# Altium footprint library my Library.PcbLib: 1247 footprints (part 48 of 78)
Each footprint in its own frame and in the unit in brackets; x right, y up, seen from the top. Pads: shape width x height; smd on the part's side, far side on the other; paste and mask are expansions set on the pad; w line width, h text height; cw(c..) or ccw(c..) is an arc to the next point about the centre after c.
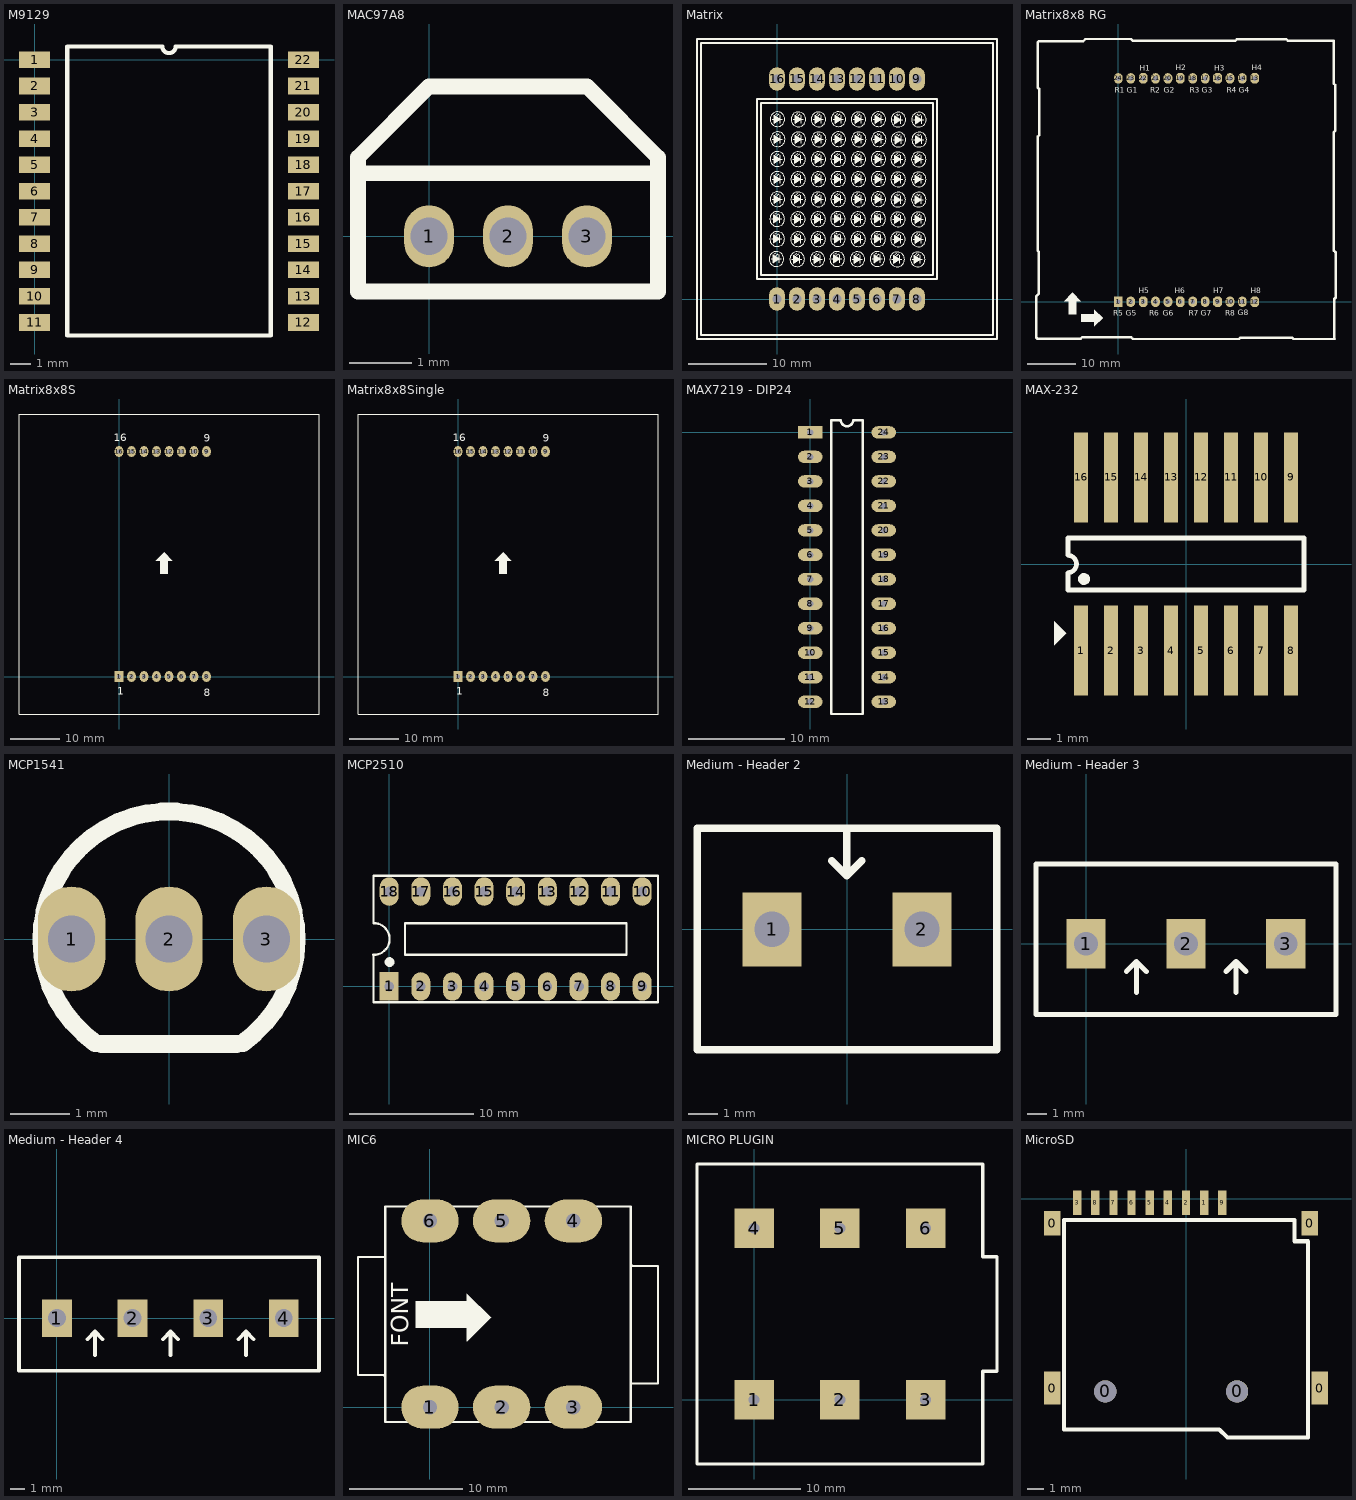
[diagram p47: the footprints below, top view; thin cyan lines are the x and y axes]

## M9129 [mm]
height 7.62
pads (22):
  rect 1.5x0.8 smd: 1(0,0) 2(0,-1.27) 3(0,-2.54) 4(0,-3.81) 5(0,-5.08) 6(0,-6.35) 7(0,-7.62) 8(0,-8.89) 9(0,-10.16) 10(0,-11.43) 11(0,-12.7) 12(13,-12.7) 13(13,-11.43) 14(13,-10.16) 15(13,-8.89) 16(13,-7.62) 17(13,-6.35) 18(13,-5.08) 19(13,-3.81) 20(13,-2.54) 21(13,-1.27) 22(13,0)
Top Overlay:
  lines w0.2: 1.585,-13.335 1.585,0.635 6.182,0.635 ccw(c6.5,0.635) 6.817,0.635 11.415,0.635 11.415,-13.335 1.585,-13.335
3D body: height 2.2, standoff 0.06, extent 0.001,-13.95 13.201,1.25

## MAC97A8 [mm]
pads (3):
  oval 0.8x1 hole 0.6: 1(0,0) 2(1.27,0) 3(2.54,0)
Top Overlay:
  lines w0.254: -1.143,1.016 3.683,1.016 ; -1.143,1.016 -1.143,1.27 0,2.413 2.54,2.413 3.683,1.27 3.683,1.016 ; -1.143,1.016 -1.143,-0.889 3.683,-0.889 3.683,1.016

## Matrix [mm]
pads (16):
  oval 2x3 hole 1.2: 1(0,0) 2(2.54,0) 3(5.08,0) 4(7.62,0) 5(10.16,0) 6(12.7,0) 7(15.24,0) 8(17.78,0) 9(17.78,27.94) 10(15.24,27.94) 11(12.7,27.94) 12(10.16,27.94) 13(7.62,27.94) 14(5.08,27.94) 15(2.54,27.94) 16(0,27.94)
Top Overlay:
  drawing of 592 lines, arcs and shapes, not listed
3D body "User Library-Bicolor-LED-Matrix.step": height 8.02, standoff -5.98, extent -7.364,-2.157 24.636,29.843

## Matrix8x8 RG [mil] "Matran 8x8 2mau,Body 60 X 60mm"
height 300
pads (24):
  rect 70x85 hole 37.4: 1(0,0)
  oval 70x85 hole 37.4: 2(100,0) 4(300,0) 5(400,0) 7(600,0) 8(700,0) 10(900,0) 11(1000,0) 14(1000,1800) 15(900,1800) 17(700,1800) 18(600,1800) 20(400,1800) 21(300,1800) 23(100,1800) 24(0,1800)
  oct 70x85 hole 37.4: 3(200,0) 6(500,0) 9(800,0) 12(1100,0) 13(1100,1800) 16(800,1800) 19(500,1800) 22(200,1800)
Top Overlay:
  region: -437,5 -371,71 -369,71 -304,6 -304,5 -341,5 -341,-101 -400,-101 -400,5
  region: -193,-63 -127,-129 -127,-131 -192,-196 -193,-196 -193,-159 -299,-159 -299,-100 -193,-100
  lines w20: -650,-300 -661,-289 -661,45 -640,66 -640,403 -650,413 -650,1331 -639,1342 -639,1716 -650,1727 -650,2090 -640,2100 -283,2100 -265,2118 103,2118 119,2102 941,2102 955,2116 1355,2116 1369,2102 1736,2102 1738,2100 1738,1757 1749,1746 1749,1379 1738,1368 1738,412 1752,398 1752,33 1742,23 1742,-299 1743,-300 1412,-300 1400,-288 984,-288 972,-300 117,-300 103,-286 -292,-286 -304,-298 -648,-298
  text "R8" at 863,-111 h45
  text "G8" at 962,-110 h45
  text "H8" at 1068,69 h45
  text "R7" at 568,-112 h45
  text "G7" at 664,-111 h45
  text "H7" at 765,68 h45
  text "R6" at 250,-111 h45
  text "G6" at 358,-111 h45
  text "H6" at 456,69 h45
  text "H5" at 166,68 h45
  text "G5" at 60,-111 h45
  text "R5" at -40,-112 h45
  text "R1" at -28,1684 h45
  text "G1" at 68,1685 h45
  text "H1" at 174,1864 h45
  text "H2" at 464,1865 h45
  text "G2" at 366,1685 h45
  text "R2" at 258,1685 h45
  text "H3" at 773,1864 h45
  text "G3" at 672,1685 h45
  text "R3" at 576,1684 h45
  text "H4" at 1076,1865 h45
  text "G4" at 970,1686 h45
  text "R4" at 874,1685 h45
Bottom Overlay:
  text "R8" at 932,-111 h45
  text "G8" at 1031,-110 h45
  text "H8" at 1137,69 h45
  text "R7" at 637,-112 h45
  text "G7" at 733,-111 h45
  text "H7" at 834,68 h45
  text "R6" at 319,-111 h45
  text "G6" at 427,-111 h45
  text "H6" at 525,69 h45
  text "H5" at 235,68 h45
  text "G5" at 129,-111 h45
  text "R5" at 29,-112 h45
  text "R1" at 41,1684 h45
  text "G1" at 137,1685 h45
  text "H1" at 243,1864 h45
  text "H2" at 533,1865 h45
  text "G2" at 435,1685 h45
  text "R2" at 327,1685 h45
  text "H3" at 842,1864 h45
  text "G3" at 741,1685 h45
  text "R3" at 645,1684 h45
  text "H4" at 1145,1865 h45
  text "G4" at 1039,1686 h45
  text "R4" at 943,1685 h45
3D body: height 150, standoff -100, extent -13.67,1785.53 16.33,1815.53
3D body: height 150, standoff -100, extent 86.33,1785.53 116.33,1815.53
3D body: height 150, standoff -100, extent 186.33,1785.53 216.33,1815.53
3D body: height 150, standoff -100, extent 286.33,1785.53 316.33,1815.53
3D body: height 150, standoff -100, extent 386.33,1785.53 416.33,1815.53
3D body: height 150, standoff -100, extent 486.33,1785.53 516.33,1815.53
3D body: height 150, standoff -100, extent 586.33,1785.53 616.33,1815.53
3D body: height 150, standoff -100, extent 686.33,1785.53 716.33,1815.53
3D body: height 150, standoff -100, extent 786.33,1785.53 816.33,1815.53
3D body: height 150, standoff -100, extent 886.33,1785.53 916.33,1815.53
3D body: height 150, standoff -100, extent 986.33,1785.53 1016.33,1815.53
3D body: height 150, standoff -100, extent -13.67,-14.47 16.33,15.53
3D body: height 150, standoff -100, extent 86.33,-14.47 116.33,15.53
3D body: height 150, standoff -100, extent 186.33,-14.47 216.33,15.53
3D body: height 150, standoff -100, extent 286.33,-14.47 316.33,15.53
3D body: height 150, standoff -100, extent 386.33,-14.47 416.33,15.53
3D body: height 150, standoff -100, extent 486.33,-14.47 516.33,15.53
3D body: height 150, standoff -100, extent 586.33,-14.47 616.33,15.53
3D body: height 150, standoff -100, extent 686.33,-14.47 716.33,15.53
3D body: height 150, standoff -100, extent 786.33,-14.47 816.33,15.53
3D body: height 150, standoff -100, extent 886.33,-14.47 916.33,15.53
3D body: height 150, standoff -100, extent 986.33,-14.47 1016.33,15.53
3D body: height 150, standoff -100, extent 1086.33,-14.47 1116.33,15.53
3D body: height 150, standoff -100, extent 1086.47,1785.67 1116.47,1815.67
3D body: height 310, standoff 299, extent -607.52,-258 -399.92,-53
3D body: height 310, standoff 299, extent -302.48,-260.78 -94.89,-55.78
3D body: height 310, standoff 299, extent -0.64,-257.89 206.95,-52.89
3D body: height 310, standoff 299, extent 291.93,-259.18 499.52,-54.18
3D body: height 310, standoff 299, extent 588.73,-261.48 796.32,-56.48
3D body: height 310, standoff 299, extent 888.49,-266.48 1096.08,-61.48
3D body: height 310, standoff 299, extent 1178.49,-261.48 1386.08,-56.48
3D body: height 310, standoff 299, extent 1490.16,-260.68 1697.75,-55.68
3D body: height 310, standoff 299, extent -607.52,42 -399.92,247
3D body: height 310, standoff 299, extent -302.48,39.22 -94.89,244.22
3D body: height 310, standoff 299, extent -0.64,42.11 206.95,247.11
3D body: height 310, standoff 299, extent 291.93,40.82 499.52,245.82
3D body: height 310, standoff 299, extent 588.73,38.52 796.32,243.52
3D body: height 310, standoff 299, extent 888.49,33.52 1096.08,238.52
3D body: height 310, standoff 299, extent 1178.49,38.52 1386.08,243.52
3D body: height 310, standoff 299, extent 1490.16,39.32 1697.75,244.32
3D body: height 310, standoff 299, extent -607.52,342 -399.92,547
3D body: height 310, standoff 299, extent -302.48,339.22 -94.89,544.22
3D body: height 310, standoff 299, extent -0.64,342.11 206.95,547.11
3D body: height 310, standoff 299, extent 291.93,340.82 499.52,545.82
3D body: height 310, standoff 299, extent 588.73,338.52 796.32,543.52
3D body: height 310, standoff 299, extent 888.49,333.52 1096.08,538.52
3D body: height 310, standoff 299, extent 1178.49,338.52 1386.08,543.52
3D body: height 310, standoff 299, extent 1490.16,339.32 1697.75,544.32
3D body: height 310, standoff 299, extent -607.52,642 -399.92,847
3D body: height 310, standoff 299, extent -302.48,639.22 -94.89,844.22
3D body: height 310, standoff 299, extent -0.64,642.11 206.95,847.11
3D body: height 310, standoff 299, extent 291.93,640.82 499.52,845.82
3D body: height 310, standoff 299, extent 588.73,638.52 796.32,843.52
3D body: height 310, standoff 299, extent 888.49,633.52 1096.08,838.52
3D body: height 310, standoff 299, extent 1178.49,638.52 1386.08,843.52
3D body: height 310, standoff 299, extent 1490.16,639.32 1697.75,844.32
3D body: height 310, standoff 299, extent -607.52,942 -399.92,1147
3D body: height 310, standoff 299, extent -302.48,939.22 -94.89,1144.22
3D body: height 310, standoff 299, extent -0.64,942.11 206.95,1147.11
3D body: height 310, standoff 299, extent 291.93,940.82 499.52,1145.82
3D body: height 310, standoff 299, extent 588.73,938.52 796.32,1143.52
3D body: height 310, standoff 299, extent 888.49,933.52 1096.08,1138.52
3D body: height 310, standoff 299, extent 1178.49,938.52 1386.08,1143.52
3D body: height 310, standoff 299, extent 1490.16,939.32 1697.75,1144.32
3D body: height 310, standoff 299, extent -607.52,1242 -399.92,1447
3D body: height 310, standoff 299, extent -302.48,1239.22 -94.89,1444.22
3D body: height 310, standoff 299, extent -0.64,1242.11 206.95,1447.11
3D body: height 310, standoff 299, extent 291.93,1240.82 499.52,1445.82
3D body: height 310, standoff 299, extent 588.73,1238.52 796.32,1443.52
3D body: height 310, standoff 299, extent 888.49,1233.52 1096.08,1438.52
3D body: height 310, standoff 299, extent 1178.49,1238.52 1386.08,1443.52
3D body: height 310, standoff 299, extent 1490.16,1239.32 1697.75,1444.32
3D body: height 310, standoff 299, extent -607.52,1542 -399.92,1747
3D body: height 310, standoff 299, extent -302.48,1539.22 -94.89,1744.22
3D body: height 310, standoff 299, extent -0.64,1542.11 206.95,1747.11
3D body: height 310, standoff 299, extent 291.93,1540.82 499.52,1745.82
3D body: height 310, standoff 299, extent 588.73,1538.52 796.32,1743.52
3D body: height 310, standoff 299, extent 888.49,1533.52 1096.08,1738.52
3D body: height 310, standoff 299, extent 1178.49,1538.52 1386.08,1743.52
3D body: height 310, standoff 299, extent 1490.16,1539.32 1697.75,1744.32
3D body: height 310, standoff 299, extent 1493.67,1837.8 1701.26,2042.8
3D body: height 310, standoff 299, extent 1182,1837 1389.59,2042
3D body: height 310, standoff 299, extent 892,1832 1099.59,2037
3D body: height 310, standoff 299, extent 592.24,1837 799.83,2042
3D body: height 310, standoff 299, extent 295.44,1839.3 503.03,2044.3
3D body: height 310, standoff 299, extent 2.87,1840.59 210.46,2045.59
3D body: height 310, standoff 299, extent -298.97,1837.69 -91.38,2042.69
3D body: height 310, standoff 299, extent -604,1840.48 -396.41,2045.48
3D body: height 309, standoff 299, extent -648,-293 1752,2102
3D body: height 300, standoff 100, extent -648,-298 1752,2102

## Matrix8x8S [mil] "Matran 8x8, Body 60 X 60mm"
height 300
pads (16):
  rect 70x85 hole 31: 1(0,0)
  oval 70x85 hole 31: 2(100,0) 3(200,0) 4(300,0) 5(400,0) 6(500,0) 7(600,0) 8(700,0) 9(700,1800) 10(600,1800) 11(500,1800) 12(400,1800) 13(300,1800) 14(200,1800) 15(100,1800) 16(0,1800)
Top Overlay:
  region: 294,927 360,993 362,993 427,928 427,927 390,927 390,821 331,821 331,927
  lines w7: -800,-300 1600,-300 ; -800,-300 1600,-300 ; -800,-300 -800,2100 ; -800,-300 -800,2100 ; -800,2100 1600,2100 ; -800,2100 1600,2100 ; 1600,-300 1600,2100 ; 1600,-300 1600,2100
  text "1" at -15,-144 h60
  text "8" at 678,-156 h60
  text "9" at 679,1880 h60
  text "16" at -42,1881 h60
3D body: height 150, standoff -100, extent 685,-15 715,15
3D body: height 150, standoff -100, extent 585,-15 615,15
3D body: height 150, standoff -100, extent 485,-15 515,15
3D body: height 150, standoff -100, extent 385,-15 415,15
3D body: height 150, standoff -100, extent 285,-15 315,15
3D body: height 150, standoff -100, extent 185,-15 215,15
3D body: height 150, standoff -100, extent 85,-15 115,15
3D body: height 150, standoff -100, extent -15,-15 15,15
3D body: height 150, standoff -100, extent 685,1785 715,1815
3D body: height 150, standoff -100, extent 585,1785 615,1815
3D body: height 150, standoff -100, extent 485,1785 515,1815
3D body: height 150, standoff -100, extent 385,1785 415,1815
3D body: height 150, standoff -100, extent 285,1785 315,1815
3D body: height 150, standoff -100, extent 185,1785 215,1815
3D body: height 150, standoff -100, extent 85,1785 115,1815
3D body: height 150, standoff -100, extent -15,1785 15,1815
3D body: height 310, standoff 299, extent -759.52,-260 -551.92,-55
3D body: height 310, standoff 299, extent -454.48,-262.78 -246.89,-57.78
3D body: height 310, standoff 299, extent -152.64,-259.89 54.95,-54.89
3D body: height 310, standoff 299, extent 139.93,-261.18 347.52,-56.18
3D body: height 310, standoff 299, extent 436.73,-263.48 644.32,-58.48
3D body: height 310, standoff 299, extent 736.49,-268.48 944.08,-63.48
3D body: height 310, standoff 299, extent 1026.49,-263.48 1234.08,-58.48
3D body: height 310, standoff 299, extent 1338.16,-262.68 1545.75,-57.68
3D body: height 310, standoff 299, extent -759.52,40 -551.92,245
3D body: height 310, standoff 299, extent -454.48,37.22 -246.89,242.22
3D body: height 310, standoff 299, extent -152.64,40.11 54.95,245.11
3D body: height 310, standoff 299, extent 139.93,38.82 347.52,243.82
3D body: height 310, standoff 299, extent 436.73,36.52 644.32,241.52
3D body: height 310, standoff 299, extent 736.49,31.52 944.08,236.52
3D body: height 310, standoff 299, extent 1026.49,36.52 1234.08,241.52
3D body: height 310, standoff 299, extent 1338.16,37.32 1545.75,242.32
3D body: height 310, standoff 299, extent -759.52,340 -551.92,545
3D body: height 310, standoff 299, extent -454.48,337.22 -246.89,542.22
3D body: height 310, standoff 299, extent -152.64,340.11 54.95,545.11
3D body: height 310, standoff 299, extent 139.93,338.82 347.52,543.82
3D body: height 310, standoff 299, extent 436.73,336.52 644.32,541.52
3D body: height 310, standoff 299, extent 736.49,331.52 944.08,536.52
3D body: height 310, standoff 299, extent 1026.49,336.52 1234.08,541.52
3D body: height 310, standoff 299, extent 1338.16,337.32 1545.75,542.32
3D body: height 310, standoff 299, extent -759.52,640 -551.92,845
3D body: height 310, standoff 299, extent -454.48,637.22 -246.89,842.22
3D body: height 310, standoff 299, extent -152.64,640.11 54.95,845.11
3D body: height 310, standoff 299, extent 139.93,638.82 347.52,843.82
3D body: height 310, standoff 299, extent 436.73,636.52 644.32,841.52
3D body: height 310, standoff 299, extent 736.49,631.52 944.08,836.52
3D body: height 310, standoff 299, extent 1026.49,636.52 1234.08,841.52
3D body: height 310, standoff 299, extent 1338.16,637.32 1545.75,842.32
3D body: height 310, standoff 299, extent -759.52,940 -551.92,1145
3D body: height 310, standoff 299, extent -454.48,937.22 -246.89,1142.22
3D body: height 310, standoff 299, extent -152.64,940.11 54.95,1145.11
3D body: height 310, standoff 299, extent 139.93,938.82 347.52,1143.82
3D body: height 310, standoff 299, extent 436.73,936.52 644.32,1141.52
3D body: height 310, standoff 299, extent 736.49,931.52 944.08,1136.52
3D body: height 310, standoff 299, extent 1026.49,936.52 1234.08,1141.52
3D body: height 310, standoff 299, extent 1338.16,937.32 1545.75,1142.32
3D body: height 310, standoff 299, extent -759.52,1240 -551.92,1445
3D body: height 310, standoff 299, extent -454.48,1237.22 -246.89,1442.22
3D body: height 310, standoff 299, extent -152.64,1240.11 54.95,1445.11
3D body: height 310, standoff 299, extent 139.93,1238.82 347.52,1443.82
3D body: height 310, standoff 299, extent 436.73,1236.52 644.32,1441.52
3D body: height 310, standoff 299, extent 736.49,1231.52 944.08,1436.52
3D body: height 310, standoff 299, extent 1026.49,1236.52 1234.08,1441.52
3D body: height 310, standoff 299, extent 1338.16,1237.32 1545.75,1442.32
3D body: height 310, standoff 299, extent -759.52,1540 -551.92,1745
3D body: height 310, standoff 299, extent -454.48,1537.22 -246.89,1742.22
3D body: height 310, standoff 299, extent -152.64,1540.11 54.95,1745.11
3D body: height 310, standoff 299, extent 139.93,1538.82 347.52,1743.82
3D body: height 310, standoff 299, extent 436.73,1536.52 644.32,1741.52
3D body: height 310, standoff 299, extent 736.49,1531.52 944.08,1736.52
3D body: height 310, standoff 299, extent 1026.49,1536.52 1234.08,1741.52
3D body: height 310, standoff 299, extent 1338.16,1537.32 1545.75,1742.32
3D body: height 310, standoff 299, extent 1341.67,1835.8 1549.26,2040.8
3D body: height 310, standoff 299, extent 1030,1835 1237.59,2040
3D body: height 310, standoff 299, extent 740,1830 947.59,2035
3D body: height 310, standoff 299, extent 440.24,1835 647.83,2040
3D body: height 310, standoff 299, extent 143.44,1837.3 351.03,2042.3
3D body: height 310, standoff 299, extent -149.13,1838.59 58.46,2043.59
3D body: height 310, standoff 299, extent -450.97,1835.69 -243.38,2040.69
3D body: height 310, standoff 299, extent -756,1838.48 -548.41,2043.48
3D body: height 309, standoff 299, extent -800,-295 1600,2100
3D body: height 300, standoff 100, extent -800,-300 1600,2100

## Matrix8x8Single [mil]
pads (16):
  rect 70x85 hole 31: 1(0,0)
  oval 70x85 hole 31: 2(100,0) 3(200,0) 4(300,0) 5(400,0) 6(500,0) 7(600,0) 8(700,0) 9(700,1800) 10(600,1800) 11(500,1800) 12(400,1800) 13(300,1800) 14(200,1800) 15(100,1800) 16(0,1800)
Top Overlay:
  region: 294,927 360,993 362,993 427,928 427,927 390,927 390,821 331,821 331,927
  lines w7: -800,-300 -800,2100 ; -800,-300 -800,2100 ; -800,-300 1600,-300 ; -800,-300 1600,-300 ; -800,2100 1600,2100 ; -800,2100 1600,2100 ; 1600,-300 1600,2100 ; 1600,-300 1600,2100
  text "16" at -42,1881 h60
  text "9" at 679,1880 h60
  text "8" at 678,-156 h60
  text "1" at -15,-144 h60
3D body: height 300, standoff 100, extent -800,-300 1600,2100
3D body: height 309, standoff 299, extent -800,-295 1600,2100
3D body: height 310, standoff 299, extent -756,1838.48 -548.41,2043.48
3D body: height 310, standoff 299, extent -450.97,1835.69 -243.38,2040.69
3D body: height 310, standoff 299, extent -149.13,1838.59 58.46,2043.59
3D body: height 310, standoff 299, extent 143.44,1837.3 351.03,2042.3
3D body: height 310, standoff 299, extent 440.24,1835 647.83,2040
3D body: height 310, standoff 299, extent 740,1830 947.59,2035
3D body: height 310, standoff 299, extent 1030,1835 1237.59,2040
3D body: height 310, standoff 299, extent 1341.67,1835.8 1549.26,2040.8
3D body: height 310, standoff 299, extent 1338.16,1537.32 1545.75,1742.32
3D body: height 310, standoff 299, extent 1026.49,1536.52 1234.08,1741.52
3D body: height 310, standoff 299, extent 736.49,1531.52 944.08,1736.52
3D body: height 310, standoff 299, extent 436.73,1536.52 644.32,1741.52
3D body: height 310, standoff 299, extent 139.93,1538.82 347.52,1743.82
3D body: height 310, standoff 299, extent -152.64,1540.11 54.95,1745.11
3D body: height 310, standoff 299, extent -454.48,1537.22 -246.89,1742.22
3D body: height 310, standoff 299, extent -759.52,1540 -551.92,1745
3D body: height 310, standoff 299, extent 1338.16,1237.32 1545.75,1442.32
3D body: height 310, standoff 299, extent 1026.49,1236.52 1234.08,1441.52
3D body: height 310, standoff 299, extent 736.49,1231.52 944.08,1436.52
3D body: height 310, standoff 299, extent 436.73,1236.52 644.32,1441.52
3D body: height 310, standoff 299, extent 139.93,1238.82 347.52,1443.82
3D body: height 310, standoff 299, extent -152.64,1240.11 54.95,1445.11
3D body: height 310, standoff 299, extent -454.48,1237.22 -246.89,1442.22
3D body: height 310, standoff 299, extent -759.52,1240 -551.92,1445
3D body: height 310, standoff 299, extent 1338.16,937.32 1545.75,1142.32
3D body: height 310, standoff 299, extent 1026.49,936.52 1234.08,1141.52
3D body: height 310, standoff 299, extent 736.49,931.52 944.08,1136.52
3D body: height 310, standoff 299, extent 436.73,936.52 644.32,1141.52
3D body: height 310, standoff 299, extent 139.93,938.82 347.52,1143.82
3D body: height 310, standoff 299, extent -152.64,940.11 54.95,1145.11
3D body: height 310, standoff 299, extent -454.48,937.22 -246.89,1142.22
3D body: height 310, standoff 299, extent -759.52,940 -551.92,1145
3D body: height 310, standoff 299, extent 1338.16,637.32 1545.75,842.32
3D body: height 310, standoff 299, extent 1026.49,636.52 1234.08,841.52
3D body: height 310, standoff 299, extent 736.49,631.52 944.08,836.52
3D body: height 310, standoff 299, extent 436.73,636.52 644.32,841.52
3D body: height 310, standoff 299, extent 139.93,638.82 347.52,843.82
3D body: height 310, standoff 299, extent -152.64,640.11 54.95,845.11
3D body: height 310, standoff 299, extent -454.48,637.22 -246.89,842.22
3D body: height 310, standoff 299, extent -759.52,640 -551.92,845
3D body: height 310, standoff 299, extent 1338.16,337.32 1545.75,542.32
3D body: height 310, standoff 299, extent 1026.49,336.52 1234.08,541.52
3D body: height 310, standoff 299, extent 736.49,331.52 944.08,536.52
3D body: height 310, standoff 299, extent 436.73,336.52 644.32,541.52
3D body: height 310, standoff 299, extent 139.93,338.82 347.52,543.82
3D body: height 310, standoff 299, extent -152.64,340.11 54.95,545.11
3D body: height 310, standoff 299, extent -454.48,337.22 -246.89,542.22
3D body: height 310, standoff 299, extent -759.52,340 -551.92,545
3D body: height 310, standoff 299, extent 1338.16,37.32 1545.75,242.32
3D body: height 310, standoff 299, extent 1026.49,36.52 1234.08,241.52
3D body: height 310, standoff 299, extent 736.49,31.52 944.08,236.52
3D body: height 310, standoff 299, extent 436.73,36.52 644.32,241.52
3D body: height 310, standoff 299, extent 139.93,38.82 347.52,243.82
3D body: height 310, standoff 299, extent -152.64,40.11 54.95,245.11
3D body: height 310, standoff 299, extent -454.48,37.22 -246.89,242.22
3D body: height 310, standoff 299, extent -759.52,40 -551.92,245
3D body: height 310, standoff 299, extent 1338.16,-262.68 1545.75,-57.68
3D body: height 310, standoff 299, extent 1026.49,-263.48 1234.08,-58.48
3D body: height 310, standoff 299, extent 736.49,-268.48 944.08,-63.48
3D body: height 310, standoff 299, extent 436.73,-263.48 644.32,-58.48
3D body: height 310, standoff 299, extent 139.93,-261.18 347.52,-56.18
3D body: height 310, standoff 299, extent -152.64,-259.89 54.95,-54.89
3D body: height 310, standoff 299, extent -454.48,-262.78 -246.89,-57.78
3D body: height 310, standoff 299, extent -759.52,-260 -551.92,-55
3D body: height 150, standoff -100, extent -15,1785 15,1815
3D body: height 150, standoff -100, extent 85,1785 115,1815
3D body: height 150, standoff -100, extent 185,1785 215,1815
3D body: height 150, standoff -100, extent 285,1785 315,1815
3D body: height 150, standoff -100, extent 385,1785 415,1815
3D body: height 150, standoff -100, extent 485,1785 515,1815
3D body: height 150, standoff -100, extent 585,1785 615,1815
3D body: height 150, standoff -100, extent 685,1785 715,1815
3D body: height 150, standoff -100, extent -15,-15 15,15
3D body: height 150, standoff -100, extent 85,-15 115,15
3D body: height 150, standoff -100, extent 185,-15 215,15
3D body: height 150, standoff -100, extent 285,-15 315,15
3D body: height 150, standoff -100, extent 385,-15 415,15
3D body: height 150, standoff -100, extent 485,-15 515,15
3D body: height 150, standoff -100, extent 585,-15 615,15
3D body: height 150, standoff -100, extent 685,-15 715,15

## MAX7219 - DIP24 [mm]
pads (24):
  rect 2.54x1.27 hole 0.635: 1(0,0)
  oval 2.54x1.27 hole 0.635: 2(0,-2.54) 3(0,-5.08) 4(0,-7.62) 5(0,-10.16) 6(0,-12.7) 7(0,-15.24) 8(0,-17.78) 9(0,-20.32) 10(0,-22.86) 11(0,-25.4) 12(0,-27.94) 13(7.62,-27.94) 14(7.62,-25.4) 15(7.62,-22.86) 16(7.62,-20.32) 17(7.62,-17.78) 18(7.62,-15.24) 19(7.62,-12.7) 20(7.62,-10.16) 21(7.62,-7.62) 22(7.62,-5.08) 23(7.62,-2.54) 24(7.62,0)
Top Overlay:
  lines w0.254: 2.159,-29.21 2.159,1.27 3.175,1.27 ccw(c3.81,1.27) 4.445,1.27 5.461,1.27 5.461,-29.21 2.159,-29.21

## MAX-232 [mm] "SO-G16"
pads (16):
  rect 0.6x3.81 smd: 1(-4.445,-3.667) 2(-3.175,-3.667) 3(-1.905,-3.667) 4(-0.635,-3.667) 5(0.635,-3.667) 6(1.905,-3.667) 7(3.175,-3.667) 8(4.445,-3.667) 9(4.445,3.667) 10(3.175,3.667) 11(1.905,3.667) 12(0.635,3.667) 13(-0.635,3.667) 14(-1.905,3.667) 15(-3.175,3.667) 16(-4.445,3.667)
Top Overlay:
  circle w0.25: c-4.316,-0.635 r0.125
  region: -5.588,-3.429 -5.08,-2.921 -5.588,-2.413
  lines w0.2: -5,-1.1 -5,-0.367 ccw(c-5,0) -5,0.367 -5,1.1 5,1.1 5,-1.1 -5,-1.1
3D body "User Library-SOIC16_Wide_JEDEC_MS-013AA.STEP": height 2.57, standoff -0.08, extent -5.25,-5.315 5.25,5.315

## MCP1541 [mil]
pads (3):
  oval 45x70 hole 31.5: 1(-65,0) 2(0,0) 3(65,0)
Top Overlay:
  lines w12: -49.41,-69.17 cw(c0,0) 49.41,-69.17 ; -45,-70 45,-70

## MCP2510 [mil] "18 PIN, W 300mil, Pin to pin 100mil"
height 100
pads (18):
  rect 60x90 hole 31: 1(0,0)
  oval 60x90 hole 31: 2(100,0) 3(200,0) 4(300,0) 5(400,0) 6(500,0) 7(600,0) 8(700,0) 9(800,0) 10(800,300) 11(700,300) 12(600,300) 13(500,300) 14(400,300) 15(300,300) 16(200,300) 17(100,300) 18(0,300)
Top Overlay:
  circle w15: c1,77 r8
  lines w7: -50.38,100.05 ccw(c-48.69,150.02) -50,200 ; -50,100 -50,-50 850,-50 850,350 -50,350 -50,201 ; 50,100 750,100 750,200 50,200 50,100
3D body "User Library-DIP18-1.STEP": height 179.92, standoff -150, extent -59.48,-6.94 855.48,300.94

## Medium - Header 2 [mm]
pads (2):
  rect 2x2.5 hole 1.2: 1(-2.54,0) 2(2.54,0)
Top Overlay:
  lines w0.254: -0.521,2.324 -0.013,1.816 ; -0.013,3.378 -0.013,1.816 ; 0.495,2.324 -0.013,1.816 ; -5.08,-4.077 5.08,-4.077 5.08,3.429 -5.08,3.429 -5.08,-4.077
3D body: height 10, standoff -4, extent -5,-4.071 5,3.429

## Medium - Header 3 [mm]
pads (3):
  rect 2x2.5 hole 1.2: 1(0,0) 2(5.08,0) 3(10.147,0)
Top Overlay:
  lines w0.254: 2.045,-1.41 2.553,-0.902 ; 2.553,-2.464 2.553,-0.902 ; 3.061,-1.41 2.553,-0.902 ; 7.112,-1.41 7.62,-0.902 ; 7.62,-2.464 7.62,-0.902 ; 8.128,-1.41 7.62,-0.902 ; -2.54,-3.581 12.7,-3.581 12.7,4.064 -2.54,4.064 -2.54,-3.581
3D body: height 10, standoff -4, extent -2.42,-3.505 12.58,3.995

## Medium - Header 4 [mm]
pads (4):
  rect 2x2.5 hole 1.2: 1(0,0) 2(5.08,0) 3(10.147,0) 4(15.215,0)
Top Overlay:
  lines w0.254: 2.045,-1.41 2.553,-0.902 ; 2.553,-2.464 2.553,-0.902 ; 3.061,-1.41 2.553,-0.902 ; 7.112,-1.41 7.62,-0.902 ; 7.62,-2.464 7.62,-0.902 ; 8.128,-1.41 7.62,-0.902 ; 12.179,-1.41 12.687,-0.902 ; 12.687,-2.464 12.687,-0.902 ; 13.195,-1.41 12.687,-0.902 ; -2.54,-3.531 17.577,-3.531 17.577,4.089 -2.54,4.089 -2.54,-3.531
3D body: height 10, standoff -4, extent -2.431,-3.461 17.569,4.039

## MIC6 [mm] "Jac Mic 6 pin to"
pads (6):
  oval 5.08x3.81 hole 1.27: 1(0,0) 2(6.35,0) 3(12.7,0) 4(12.7,16.51) 5(6.35,16.51) 6(0,16.51)
Top Overlay:
  region: -1.27,9.373 -1.27,7.036 3.302,7.036 3.277,7.061 3.277,5.842 3.302,5.842 5.385,7.925 5.41,7.925 3.277,10.058 3.277,9.373
  lines w0.178: -3.962,-1.295 -3.962,17.755 ; -3.962,2.261 -3.962,13.335 -4.013,13.284 -6.375,13.284 -6.375,2.845 -4.115,2.845 -3.962,2.692 ; -3.962,17.78 17.78,17.78 17.78,14.986 ; -3.937,-1.321 -3.912,-1.295 -3.886,-1.321 17.78,-1.321 17.78,2.083 ; 17.78,12.675 17.932,12.522 20.193,12.522 20.193,2.083 17.831,2.083 17.78,2.032 17.78,15.088
  text "FONT" at -1.905,5.334 h1.52

## MICRO PLUGIN [mil]
pads (6):
  rect 137.8x137.8 / inner round 62 / far side rect 137.8x137.8 hole 38: 1(0,0) 2(300,0) 3(600,0) 4(0,600) 5(300,600) 6(600,600)
Top Overlay:
  lines w11.82: -200,-225 -200,825 800,825 800,500 850,500 850,100 800,100 800,-225 -200,-225

## MicroSD [mm]
pads (15):
  rect 1x2 smd: 0(-8.1,-11.5) 0(8.1,-11.5)
  rect 1x1.5 smd: 0(-8.1,-1.5) 0(7.5,-1.5)
  round 1.35 hole 1.35: 0(-4.9,-11.7) 0(3.1,-11.7)
  rect 0.5x1.5 smd: 1(1.1,-0.254) 2(0,-0.254) 3(-6.6,-0.254) 4(-1.1,-0.254) 5(-2.2,-0.254) 6(-3.3,-0.254) 7(-4.4,-0.254) 8(-5.5,-0.254) 9(2.2,-0.254)
Top Overlay:
  lines w0.254: -7.4,-14 0,-14 2.015,-14 2.515,-14.5 7.4,-14.5 7.4,-2.591 6.579,-2.591 6.579,-1.295 -7.4,-1.295 -7.4,-14
3D body "User Library-Socket-MicroSD-Type1-with-SDCard.STEP": height 1.91, standoff -0.43, extent -6.95,-19.6 7.15,0.5